# Altium footprint library Mylib.PcbLib: 294 footprints (part 6 of 19)
Each footprint in its own frame and in the unit in brackets; x right, y up, seen from the top. Pads: shape width x height; smd on the part's side, far side on the other; paste and mask are expansions set on the pad; w line width, h text height; cw(c..) or ccw(c..) is an arc to the next point about the centre after c.
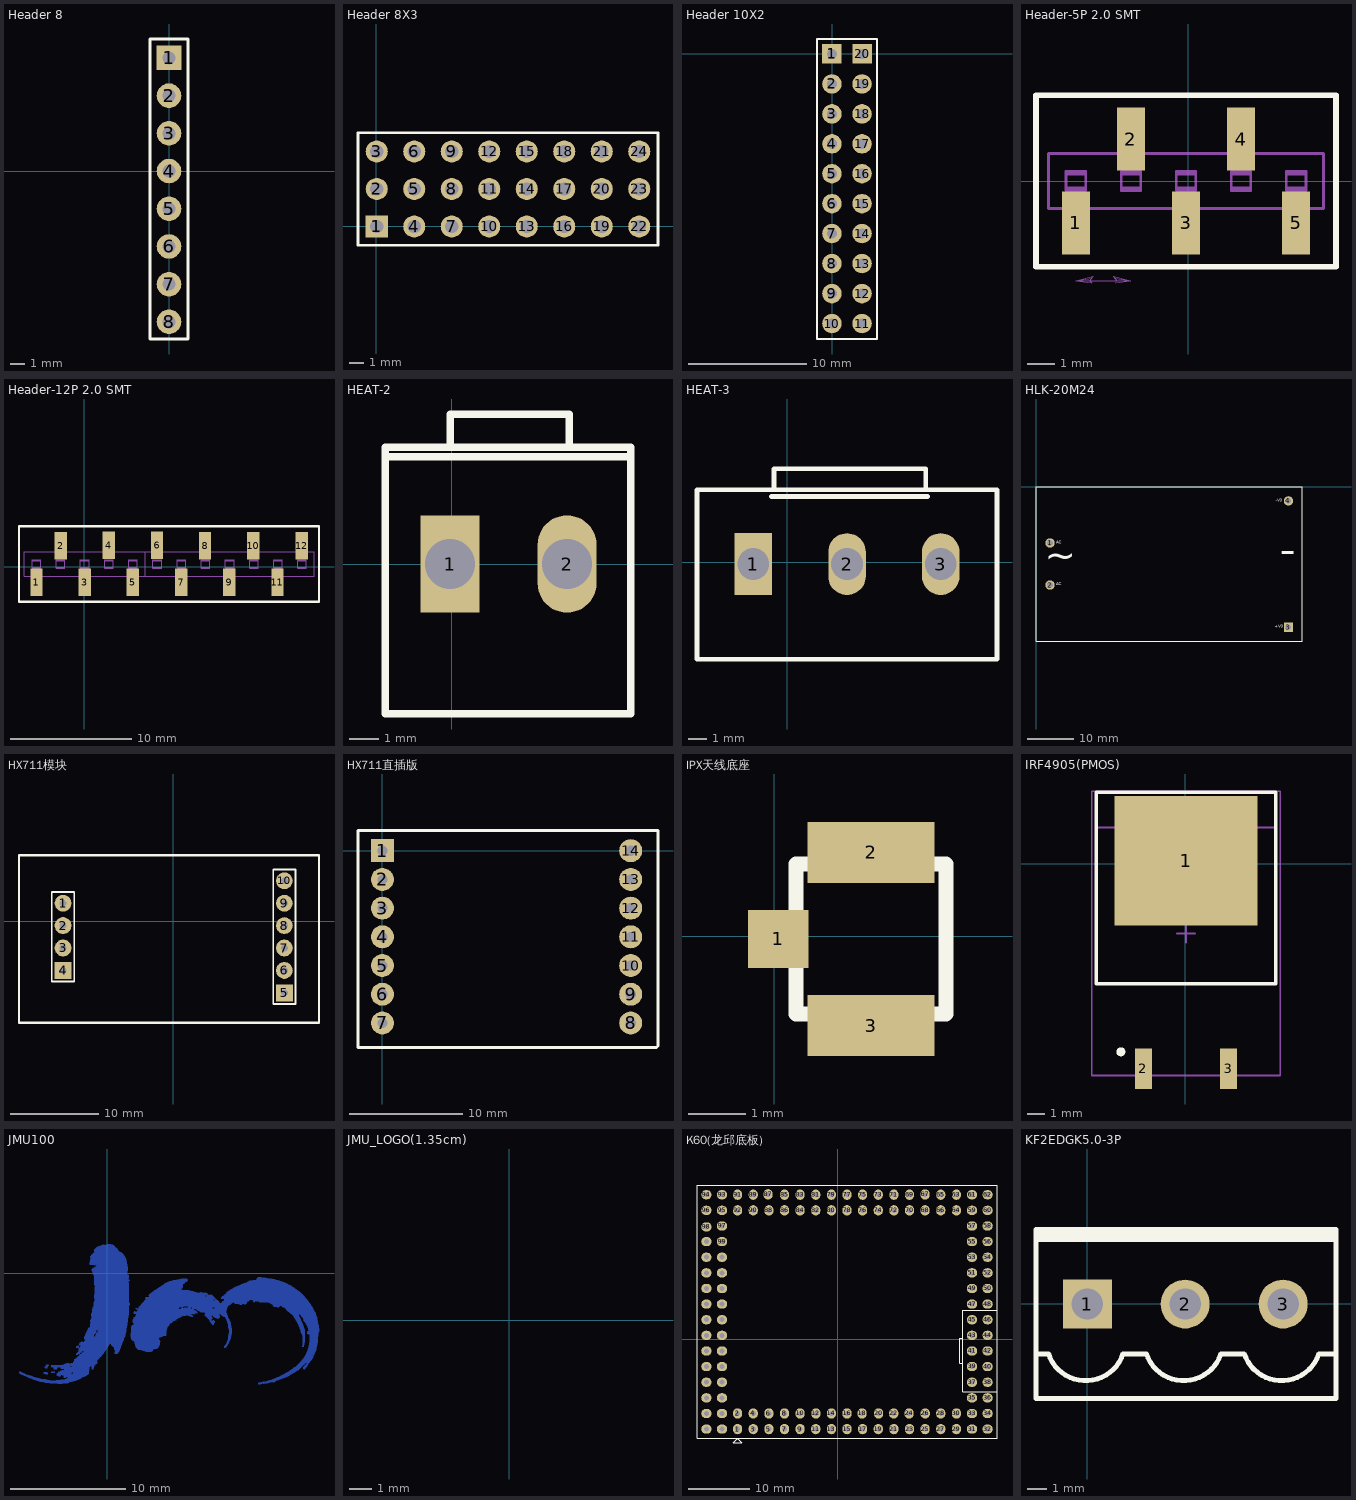
[diagram p5: the footprints below, top view; thin cyan lines are the x and y axes]

## Header 8 [mil]
pads (8):
  rect 65x65 hole 34: 1(0,300)
  round 65 hole 34: 2(0,200) 3(0,100) 4(0,0) 5(0,-99.8) 6(0,-199.8) 8(0,-399.61)
  round 65 hole 34 paste+0: 7(0,-299.61)
Top Overlay:
  lines w7.87: -50,-445 -50,350 50,350 50,-445 -50,-445
3D body "HDR1X8_2.54mm.STEP": height 336.22, standoff -118.11, extent -49,-451 51,349

## Header 8X3 [mm]
pads (24):
  rect 1.5x1.5 hole 0.9: 1(0.025,0)
  round 1.5 hole 0.9: 2(0.025,2.54) 3(0.025,5.08) 4(2.565,0) 5(2.565,2.54) 6(2.565,5.08) 7(5.105,0) 8(5.105,2.54) 9(5.105,5.08) 10(7.645,0) 11(7.645,2.54) 12(7.645,5.08) 13(10.185,0) 14(10.185,2.54) 15(10.185,5.08) 16(12.725,0) 17(12.725,2.54) 18(12.725,5.08) 19(15.265,0) 20(15.265,2.54) 21(15.265,5.08) 22(17.805,0) 23(17.805,2.54) 24(17.805,5.08)
Top Overlay:
  lines w0.2: -1.245,6.299 -1.245,-1.27 19.075,-1.27 19.075,6.299 ; -1.245,6.35 19.075,6.35
3D body "HEADER.STEP": height 7.58, standoff -2.94, extent 16.535,1.27 19.075,3.81
3D body "HEADER.STEP": height 7.58, standoff -2.94, extent 16.535,-1.27 19.075,1.27
3D body "HEADER.STEP": height 7.58, standoff -2.94, extent 13.995,1.27 16.535,3.81
3D body "HEADER.STEP": height 7.58, standoff -2.94, extent 13.995,-1.27 16.535,1.27
3D body "HEADER.STEP": height 7.58, standoff -2.94, extent 11.455,1.27 13.995,3.81
3D body "HEADER.STEP": height 7.58, standoff -2.94, extent 11.455,-1.27 13.995,1.27
3D body "HEADER.STEP": height 7.58, standoff -2.94, extent 8.915,1.27 11.455,3.81
3D body "HEADER.STEP": height 7.58, standoff -2.94, extent 8.915,-1.27 11.455,1.27
3D body "HEADER.STEP": height 7.58, standoff -2.94, extent 6.375,1.27 8.915,3.81
3D body "HEADER.STEP": height 7.58, standoff -2.94, extent 6.375,-1.27 8.915,1.27
3D body "HEADER.STEP": height 7.58, standoff -2.94, extent 3.835,1.27 6.375,3.81
3D body "HEADER.STEP": height 7.58, standoff -2.94, extent 3.835,-1.27 6.375,1.27
3D body "HEADER.STEP": height 7.58, standoff -2.94, extent 1.295,1.27 3.835,3.81
3D body "HEADER.STEP": height 7.58, standoff -2.94, extent 1.295,-1.27 3.835,1.27
3D body "HEADER.STEP": height 7.58, standoff -2.94, extent -1.245,1.27 1.295,3.81
3D body "HEADER.STEP": height 7.58, standoff -2.94, extent -1.245,-1.27 1.295,1.27
3D body "HEADER.STEP": height 7.58, standoff -2.94, extent -1.245,3.81 1.295,6.35
3D body "HEADER.STEP": height 7.58, standoff -2.94, extent 1.295,3.81 3.835,6.35
3D body "HEADER.STEP": height 7.58, standoff -2.94, extent 3.835,3.81 6.375,6.35
3D body "HEADER.STEP": height 7.58, standoff -2.94, extent 6.375,3.81 8.915,6.35
3D body "HEADER.STEP": height 7.58, standoff -2.94, extent 8.915,3.81 11.455,6.35
3D body "HEADER.STEP": height 7.58, standoff -2.94, extent 11.455,3.81 13.995,6.35
3D body "HEADER.STEP": height 7.58, standoff -2.94, extent 13.995,3.81 16.535,6.35
3D body "HEADER.STEP": height 7.58, standoff -2.94, extent 16.535,3.81 19.075,6.35

## Header 10X2 [mil]
pads (20):
  rect 65x65 hole 34: 1(-0.98,-0.2) 20(99.41,-0.2)
  round 65 hole 34: 2(-0.98,-100.2) 3(-0.98,-200.2) 4(-0.98,-300.2) 5(-0.98,-400) 6(-0.98,-500) 8(-0.98,-699.8) 10(-0.98,-900.2) 11(99.41,-900.2) 13(99.41,-699.8) 15(99.41,-500) 16(99.41,-400) 17(99.41,-300.2) 18(99.41,-200.2) 19(99.41,-100.2)
  round 65 hole 34 paste+0: 7(-0.98,-599.8) 9(-0.98,-800.2) 12(99.41,-800.2) 14(99.41,-599.8)
Top Overlay:
  lines w7.87: 49.02,-951.77 -50.98,-951.77 -50.98,49.8 49.02,49.8 ; 49.41,-951.77 149.41,-951.77 149.41,49.8 49.41,49.8
3D body "HDR-1x2_H.STEP": height 200.79, standoff -118.11, extent -13.19,-347.83 492.72,-247.83
3D body "HDR-1x2_H.STEP": height 200.79, standoff -118.11, extent -13.19,-447.83 492.72,-347.83
3D body "HDR-1x2_H.STEP": height 200.79, standoff -118.11, extent -13.19,-147.83 492.72,-47.83
3D body "HDR-1x2_H.STEP": height 200.79, standoff -118.11, extent -13.19,-247.83 492.72,-147.83
3D body "HDR-1x2_H.STEP": height 200.79, standoff -118.11, extent -13.19,-47.83 492.72,52.17
3D body "HDR-1x2_H.STEP": height 200.79, standoff -118.11, extent -13.19,-847.83 492.72,-747.83
3D body "HDR-1x2_H.STEP": height 200.79, standoff -118.11, extent -13.19,-947.83 492.72,-847.83
3D body "HDR-1x2_H.STEP": height 200.79, standoff -118.11, extent -13.19,-647.83 492.72,-547.83
3D body "HDR-1x2_H.STEP": height 200.79, standoff -118.11, extent -13.19,-747.83 492.72,-647.83
3D body "HDR-1x2_H.STEP": height 200.79, standoff -118.11, extent -13.19,-547.83 492.72,-447.83

## Header-5P 2.0 SMT [mil] "贴片单排"
pads (5):
  rect 40.16x90.16 smd mask+0: 1(-160.48,-60) 2(-81.74,60) 3(-3,-60) 4(75.74,60) 5(154.48,-60)
Top Overlay:
  lines w7.87: -217.53,-122.84 -217.53,122.84 211.53,122.84 211.53,-122.84 -217.53,-122.84
Top Paste:
  region: 134.4,-105.08 134.4,-14.92 174.56,-14.92 174.56,-105.08
  region: 55.66,14.92 55.66,105.08 95.82,105.08 95.82,14.92
  region: -23.08,-105.08 -23.08,-14.92 17.08,-14.92 17.08,-105.08
  region: -101.82,14.92 -101.82,105.08 -61.66,105.08 -61.66,14.92
  region: -180.56,-105.08 -180.56,-14.92 -140.4,-14.92 -140.4,-105.08
Top Solder:
  region: 132.39,-107.09 132.39,-12.91 176.57,-12.91 176.57,-107.09
  region: 53.65,12.91 53.65,107.09 97.83,107.09 97.83,12.91
  region: -25.09,-107.09 -25.09,-12.91 19.09,-12.91 19.09,-107.09
  region: -103.83,12.91 -103.83,107.09 -59.65,107.09 -59.65,12.91
  region: -182.57,-107.09 -182.57,-12.91 -138.39,-12.91 -138.39,-107.09
Mechanical 3:
  lines w3.94: -174.5,-10 -146.47,-10 ; -174.5,10 -146.47,10 ; -170.48,-39.33 -170.48,-85 -150.48,-85 -150.48,-39.33 ; -121.15,-39.33 -199.81,-39.33 -199.81,39.33 -121.15,39.33 ; -121.07,-39.33 -42.41,-39.33 ; -121.07,39.33 -42.41,39.33 ; -95.76,-10 -67.72,-10 ; -95.76,10 -67.72,10 ; -91.74,39.33 -91.74,85 -71.74,85 -71.74,39.33 ; -42.33,-39.33 36.33,-39.33 ; -42.33,39.33 36.33,39.33 ; -17.02,-10 11.02,-10 ; -17.02,10 11.02,10 ; -13,-39.33 -13,-85 7,-85 7,-39.33 ; 36.41,-39.33 115.07,-39.33 ; 36.41,39.33 115.07,39.33 ; 61.72,-10 89.76,-10 ; 61.72,10 89.76,10 ; 65.74,39.33 65.74,85 85.74,85 85.74,39.33 ; 115.15,-39.33 193.81,-39.33 193.81,39.33 115.15,39.33 ; 140.47,-10 168.5,-10 ; 140.47,10 168.5,10 ; 144.48,-39.33 144.48,-85 164.48,-85 164.48,-39.33 ; -174.5,-14.02 -146.47,-14.02 -146.47,14.02 -174.5,14.02 -174.5,-14.02 ; -95.76,-14.02 -67.72,-14.02 -67.72,14.02 -95.76,14.02 -95.76,-14.02 ; -17.02,-14.02 11.02,-14.02 11.02,14.02 -17.02,14.02 -17.02,-14.02 ; 61.72,-14.02 89.76,-14.02 89.76,14.02 61.72,14.02 61.72,-14.02 ; 140.47,-14.02 140.47,14.02 168.5,14.02 168.5,-14.02 140.47,-14.02
Mechanical 30:
  lines w0: -104.22,-145.63 -81.74,-142.52 ; -160.48,-142.52 -81.74,-142.52 ; -160.48,-142.52 -137.96,-139.37 -135.48,-136.26 ; -160.48,-142.52 -140.48,-142.52 ; -160.48,-142.52 -137.96,-145.63 -140.48,-142.52 ; -160.48,-142.52 -135.48,-136.26 ; -140.48,-142.52 -135.48,-136.26 ; -101.74,-142.52 -81.74,-142.52 ; -101.74,-142.52 -104.22,-139.37 -81.74,-142.52 ; -101.74,-142.52 -106.74,-136.26 -81.74,-142.52
Mechanical 32:
  lines w3.94: -217.53,-122.84 211.53,-122.84 211.53,122.84 -217.53,122.84 -217.53,-122.84

## Header-12P 2.0 SMT [mil]
pads (12):
  rect 40.16x90.16 smd mask+0: 1(-155.48,-51) 2(-76.74,69) 3(2,-51) 4(80.26,70) 5(159,-50) 6(237.74,70) 7(316.48,-50) 8(394.26,69) 9(473,-51) 10(551.74,69) 11(630.48,-51) 12(709.74,69)
Top Overlay:
  lines w7.87: -212.53,-113.84 766,-113.84 766,131.84 -212.53,131.84 -212.53,-113.84
Top Paste:
  region: -175.56,-96.08 -175.56,-5.92 -135.4,-5.92 -135.4,-96.08
  region: -96.82,23.92 -96.82,114.08 -56.66,114.08 -56.66,23.92
  region: -18.08,-96.08 -18.08,-5.92 22.08,-5.92 22.08,-96.08
  region: 60.66,23.92 60.66,114.08 100.82,114.08 100.82,23.92
  region: 139.4,-96.08 139.4,-5.92 179.56,-5.92 179.56,-96.08
  region: 296.4,-95.08 296.4,-4.92 336.56,-4.92 336.56,-95.08
  region: 531.66,23.92 531.66,114.08 571.82,114.08 571.82,23.92
  region: 452.92,-96.08 452.92,-5.92 493.08,-5.92 493.08,-96.08
  region: 373.92,24 373.92,114.16 414.08,114.16 414.08,24
  region: 217.84,25 217.84,115.16 258,115.16 258,25
  region: 610.92,-96.08 610.92,-5.92 651.08,-5.92 651.08,-96.08
  region: 689.66,23.92 689.66,114.08 729.82,114.08 729.82,23.92
Top Solder:
  region: -177.57,-98.09 -177.57,-3.91 -133.39,-3.91 -133.39,-98.09
  region: -98.83,21.91 -98.83,116.09 -54.65,116.09 -54.65,21.91
  region: -20.09,-98.09 -20.09,-3.91 24.09,-3.91 24.09,-98.09
  region: 58.65,21.91 58.65,116.09 102.83,116.09 102.83,21.91
  region: 137.39,-98.09 137.39,-3.91 181.57,-3.91 181.57,-98.09
  region: 294.39,-97.09 294.39,-2.91 338.57,-2.91 338.57,-97.09
  region: 608.39,-98.09 608.39,-3.91 652.57,-3.91 652.57,-98.09
  region: 529.65,21.91 529.65,116.09 573.83,116.09 573.83,21.91
  region: 450.91,-98.09 450.91,-3.91 495.09,-3.91 495.09,-98.09
  region: 371.82,22 371.82,116.18 416,116.18 416,22
  region: 215.91,22 215.91,116.18 260.09,116.18 260.09,22
  region: 687.65,21.91 687.65,116.09 731.83,116.09 731.83,21.91
Mechanical 3:
  drawing of 156 lines, arcs and shapes, not listed

## HEAT-2 [mm]
pads (2):
  rect 2x3.3 hole 1.7: 1(-0.051,0.007)
  oval 2x3.3 hole 1.7: 2(3.909,0.007)
Top Overlay:
  lines w0.254: -2.251,3.639 6.069,3.639 ; -0.051,3.967 -0.051,5.087 3.988,5.087 3.988,3.967 ; -2.251,-5.073 -2.251,3.967 6.069,3.967 6.069,-5.073 -2.251,-5.073
3D body "molex-22-27-2021.STEP": height 11.68, standoff -3.56, extent -0.47,-3.57 4.61,2.78

## HEAT-3 [mm]
pads (3):
  rect 2x3.3 hole 1.7: 1(-1.8,-0.1)
  oval 2x3.3 hole 1.7: 2(3.2,-0.1) 3(8.2,-0.1)
Top Overlay:
  lines w0.254: -0.82,3.5 7.5,3.5 ; -0.7,3.867 -0.7,4.987 2.359,4.987 4.378,4.987 7.4,4.987 7.4,3.867 ; -4.8,-5.173 11.2,-5.173 11.2,3.867 -4.8,3.867 -4.8,-5.173
3D body "molex-22-27-2031.STEP": height 11.68, standoff -3.56, extent -0.457,-3.734 7.163,2.616

## HLK-20M24 [mm] "HILINK 24V隔离电源模块"
pads (4):
  round 2 hole 1.2: 1(3,-12) 2(3,-21) 4(54,-3)
  rect 2x2 hole 1.2: 3(54,-30)
Top Overlay:
  lines w0.1: 0,-33 0,0 57,0 57,-33 0,-33
  text "-V0" at 51.317,-3.4 h1.02
  text "+V0" at 51.075,-30.4 h1.02
  text "AC" at 4.375,-21.275 h1.02
  text "AC" at 4.375,-12.35 h1.02
  text "~" at 1.925,-19.35 h10
  text "-" at 52.175,-18.856 h12
3D body "20M4_3.step": height 22.6, standoff -6, extent 0,-33 57,0

## HX711模块 [mil]
pads (10):
  round 75 hole 30: 1(-492.49,81.19) 2(-492.49,-18.81) 3(-492.49,-118.81) 6(495.26,-219) 7(495.26,-119) 8(495.26,-19) 9(495.26,81) 10(495.26,181)
  rect 75x75 hole 30: 4(-492.49,-218.81) 5(495.26,-319)
Top Overlay:
  lines w7.87: -542.49,-268.81 -542.49,131.19 -442.49,131.19 -442.49,-268.81 -542.49,-268.81 ; 445.26,-369 445.26,231 545.26,231 545.26,-369 445.26,-369
  lines w10: -688.98,-452.76 -688.98,295.28 649.61,295.28 649.61,-452.76 -688.98,-452.76
3D body: height 340, standoff 300, extent -669.29,-433.07 629.92,275.59
3D body: height 336.22, standoff -118.11, extent -540.94,-262.99 -440.94,137.01
3D body: height 336.22, standoff -118.11, extent 445.26,-368.99 545.26,231.01

## HX711直插版 [mil]
pads (14):
  rect 80x80 hole 35.43: 1(0,0)
  round 80 hole 35.43: 2(0,-100) 3(0,-200) 4(0,-300) 5(0,-400) 6(0,-500) 7(0,-600) 8(865,-600) 9(865,-500) 10(865,-400) 11(865,-300) 12(865,-200) 13(865,-100) 14(865,0)
Top Overlay:
  lines w10: -85,-685 955,-685 960,-680 960,70 -85,70 -85,-685
Bottom Overlay:
  lines w7.87: -50,-650 -50,50 50,50 50,-650 -50,-650 ; 815,-650 915,-650 915,50 815,50 815,-650

## IPX天线底座 [mm]
pads (3):
  rect 1.05x1 smd: 1(0.073,-0.048)
  rect 2.2x1.05 smd: 2(1.681,1.452) 3(1.681,-1.548)
Top Overlay:
  lines w0.254: 0.381,-1.348 0.381,1.252 2.981,1.252 2.981,-1.348 0.381,-1.348
3D body "User Library-1909763-1.STEP": height 1.3, standoff 0.02, extent 0.149,-1.574 2.999,1.426

## IRF4905(PMOS) [mm] "IRF4905"
pads (3):
  rect 8x7.2 smd: 1(0.047,0.174)
  rect 0.95x2.25 smd: 2(-2.333,-11.426) 3(2.427,-11.426)
Top Overlay:
  circle w0.25: c-3.585,-10.478 r0.125
  lines w0.2: -4.953,-6.676 -4.953,3.998 5.047,3.998 5.047,-6.676 -4.953,-6.676
Mechanical 13:
  lines w0.1: -4.953,-6.676 5.047,-6.676 5.047,2.024 -4.953,2.024 -4.953,-6.676
Mechanical 15:
  lines w0.1: -0.453,-3.876 0.547,-3.876 ; 0.047,-4.376 0.047,-3.376 ; -5.203,-11.801 5.297,-11.801 5.297,4.049 -5.203,4.049 -5.203,-11.801
3D body "User Library-DPAK-1.STEP": height 2.39, standoff -0.02, extent -3.323,-10.459 3.217,-0.52

## JMU100 [mm]
Bottom Layer:
  lines w0.043: -7.654,-8.545 -7.395,-8.545 ; -7.654,-8.502 -7.481,-8.502 ; -7.611,-8.588 -7.309,-8.588 ; -7.525,-8.631 -7.179,-8.631 ; -7.481,-8.675 -7.136,-8.675 ; -7.395,-8.718 -7.05,-8.718 ; -7.266,-8.761 -6.92,-8.761 ; -7.179,-8.804 -6.747,-8.804 ; -7.05,-8.847 -6.575,-8.847 ; -6.963,-8.89 -6.488,-8.89 ; -6.877,-8.934 -6.402,-8.934 ; -6.791,-8.977 -6.272,-8.977 ; -6.704,-9.02 -6.056,-9.02 ; -6.531,-9.063 -5.884,-9.063 ; -6.445,-9.106 -5.754,-9.106 ; -6.359,-9.15 -5.366,-9.15 ; -6.186,-9.193 -5.193,-9.193 ; -6.1,-9.236 -4.977,-9.236 ; -5.927,-9.279 -2.904,-9.279 ; -5.841,-9.322 -3.034,-9.322 ; -5.495,-9.365 -3.293,-9.365 ; -5.495,-8.631 -5.15,-8.631 ; -5.495,-8.588 -5.15,-8.588 ; -5.495,-8.545 -5.236,-8.545 ; -5.409,-8.113 -5.193,-8.113 ; -5.409,-8.07 -5.193,-8.07 ; -5.366,-9.409 -3.336,-9.409 ; -5.366,-8.156 -5.193,-8.156 ; -5.322,-8.675 -5.15,-8.675 ; -5.322,-8.027 -5.15,-8.027 ; -5.322,-7.984 -5.15,-7.984 ; -5.279,-7.94 -5.063,-7.94 ; -5.279,-7.897 -5.107,-7.897 ; -4.977,-9.452 -3.422,-9.452 ; -4.847,-8.545 -4.545,-8.545 ; -4.847,-8.502 -4.545,-8.502 ; -4.847,-8.027 -3.207,-8.027 ; -4.847,-7.984 -3.207,-7.984 ; -4.847,-7.94 -1.134,-7.94 ; -4.804,-8.07 -3.207,-8.07 ; -4.632,-8.243 -4.372,-8.243 ; -4.632,-8.2 -4.372,-8.2 ; -4.632,-8.156 -4.329,-8.156 ; -4.632,-8.113 -4.329,-8.113 ; -4.416,-9.236 -2.732,-9.236 ; -4.372,-8.761 -4.027,-8.761 ; -4.372,-8.718 -1.695,-8.718 ; -4.372,-8.675 -3.12,-8.675 ; -4.329,-8.804 -4.027,-8.804 ; -4.329,-8.631 -3.12,-8.631 ; -4.286,-9.495 -3.897,-9.495 ; -4.243,-8.847 -4.027,-8.847 ; -4.243,-8.588 -3.12,-8.588 ; -4.243,-8.545 -3.077,-8.545 ; -4.243,-8.502 -1.609,-8.502 ; -4.07,-8.459 -1.609,-8.459 ; -4.027,-9.193 -2.645,-9.193 ; -4.027,-8.415 -1.609,-8.415 ; -4.027,-8.156 -1.566,-8.156 ; -4.027,-8.113 -1.566,-8.113 ; -3.984,-8.2 -1.566,-8.2 ; -3.941,-8.372 -1.566,-8.372 ; -3.897,-8.761 -1.782,-8.761 ; -3.854,-7.897 -1.048,-7.897 ; -3.768,-8.934 -3.552,-8.934 ; -3.768,-8.89 -1.998,-8.89 ; -3.768,-8.847 -1.911,-8.847 ; -3.768,-8.804 -1.825,-8.804 ; -3.725,-8.977 -3.595,-8.977 ; -3.725,-8.329 -1.566,-8.329 ; -3.725,-8.286 -1.609,-8.286 ; -3.725,-8.243 -1.609,-8.243 ; -3.725,-7.854 -1.048,-7.854 ; -3.638,-9.15 -2.516,-9.15 ; -3.638,-7.811 -1.048,-7.811 ; -3.552,-9.106 -2.429,-9.106 ; -3.509,-7.768 -3.336,-7.768 ; -3.466,-9.063 -2.343,-9.063 ; -3.422,-9.02 -2.257,-9.02 ; -3.422,-8.977 -2.213,-8.977 ; -3.422,-8.934 -2.17,-8.934 ; -3.12,-7.768 -0.918,-7.768 ; -3.077,-8.07 -1.566,-8.07 ; -3.077,-8.027 -1.523,-8.027 ; -3.077,-7.984 -1.134,-7.984 ; -2.991,-8.675 -1.652,-8.675 ; -2.948,-8.631 -1.609,-8.631 ; -2.948,-8.588 -1.609,-8.588 ; -2.948,-8.545 -1.609,-8.545 ; -2.948,-7.725 -0.875,-7.725 ; -2.948,-7.681 -0.875,-7.681 ; -2.904,-7.638 -0.875,-7.638 ; -2.904,-7.595 -0.918,-7.595 ; -2.861,-7.552 -0.918,-7.552 ; -2.861,-7.509 -0.918,-7.509 ; -2.861,-7.465 -0.875,-7.465 ; -2.861,-7.422 -0.832,-7.422 ; -2.775,-7.379 -0.789,-7.379 ; -2.688,-7.336 -0.745,-7.336 ; -2.688,-6.991 -2.559,-6.991 ; -2.688,-6.947 -2.516,-6.947 ; -2.688,-6.386 -2.473,-6.386 ; -2.688,-6.343 -2.473,-6.343 ; -2.645,-7.293 -0.702,-7.293 ; -2.645,-6.904 -2.386,-6.904 ; -2.645,-6.3 -2.473,-6.3 ; -2.602,-7.25 -0.659,-7.25 ; -2.602,-6.861 -2.386,-6.861 ; -2.559,-7.206 -0.659,-7.206 ; -2.559,-6.818 -2.343,-6.818 ; -2.559,-6.256 -2.473,-6.256 ; -2.516,-7.163 -0.573,-7.163 ; -2.516,-6.775 -2.213,-6.775 ; -2.473,-6.731 -2.213,-6.731 ; -2.473,-6.688 -2.17,-6.688 ; -2.473,-6.645 -0.184,-6.645 ; -2.473,-6.602 -0.141,-6.602 ; -2.473,-6.559 -0.141,-6.559 ; -2.473,-6.516 -0.098,-6.516 ; -2.473,-6.472 -0.098,-6.472 ; -2.473,-6.429 -0.054,-6.429 ; -2.429,-7.12 -0.529,-7.12 ; -2.429,-7.077 -0.486,-7.077 ; -2.429,-6.17 0.118,-6.17 ; -2.429,-6.127 0.161,-6.127 ; -2.429,-6.084 0.161,-6.084 ; -2.386,-7.034 -0.486,-7.034 ; -2.386,-6.991 -0.443,-6.991 ; -2.386,-6.041 1.241,-6.041 ; -2.386,-5.997 1.284,-5.997 ; -2.343,-6.386 -0.011,-6.386 ; -2.343,-6.343 -0.011,-6.343 ; -2.3,-6.3 0.032,-6.3 ; -2.3,-6.256 0.075,-6.256 ; -2.3,-6.213 0.118,-6.213 ; -2.3,-5.954 1.284,-5.954 ; -2.257,-6.947 -0.4,-6.947 ; -2.257,-5.911 -2.17,-5.911 ; -2.213,-6.904 -0.357,-6.904 ; -2.213,-6.861 -0.314,-6.861 ; -2.084,-6.818 -0.314,-6.818 ; -2.041,-6.775 -0.27,-6.775 ; -2.041,-6.731 -0.227,-6.731 ; -2.041,-6.688 -0.227,-6.688 ; -1.998,-5.911 1.327,-5.911 ; -1.998,-5.868 1.327,-5.868 ; -1.998,-5.609 1.414,-5.609 ; -1.998,-5.566 1.414,-5.566 ; -1.998,-5.522 1.457,-5.522 ; -1.998,-5.479 1.5,-5.479 ; -1.954,-5.825 1.327,-5.825 ; -1.954,-5.652 1.414,-5.652 ; -1.954,-5.436 -1.177,-5.436 ; -1.911,-5.781 1.37,-5.781 ; -1.911,-5.738 1.414,-5.738 ; -1.911,-5.695 1.414,-5.695 ; -1.911,-5.393 -1.177,-5.393 ; -1.911,-5.35 -1.177,-5.35 ; -1.911,-5.306 -1.177,-5.306 ; -1.868,-5.263 -1.134,-5.263 ; -1.868,-5.22 -1.134,-5.22 ; -1.868,-5.177 -1.091,-5.177 ; -1.825,-5.134 -0.961,-5.134 ; -1.782,-5.091 -0.961,-5.091 ; -1.782,-5.047 -0.961,-5.047 ; -1.782,-5.004 -0.961,-5.004 ; -1.738,-4.961 -0.961,-4.961 ; -1.695,-4.918 -0.961,-4.918 ; -1.695,-4.875 -0.961,-4.875 ; -1.695,-4.832 1.63,-4.832 ; -1.652,-4.788 1.63,-4.788 ; -1.652,-4.745 1.63,-4.745 ; -1.609,-4.702 1.63,-4.702 ; -1.566,0.825 1.673,0.825 ; -1.523,-4.659 1.673,-4.659 ; -1.523,0.868 1.673,0.868 ; -1.523,0.911 1.673,0.911 ; -1.523,0.955 1.673,0.955 ; -1.523,0.998 1.673,0.998 ; -1.479,-4.616 1.673,-4.616 ; -1.479,-4.572 1.673,-4.572 ; -1.479,-4.529 1.673,-4.529 ; -1.479,-4.486 1.716,-4.486 ; -1.479,-4.443 1.716,-4.443 ; -1.479,-4.4 1.716,-4.4 ; -1.479,-4.357 1.716,-4.357 ; -1.479,-4.313 1.716,-4.313 ; -1.479,-4.141 1.759,-4.141 ; -1.479,-4.097 1.759,-4.097 ; -1.479,-4.054 1.759,-4.054 ; -1.479,0.782 1.716,0.782 ; -1.479,1.041 1.63,1.041 ; -1.479,1.084 1.63,1.084 ; -1.479,1.127 1.63,1.127 ; -1.479,1.171 1.63,1.171 ; -1.479,1.214 1.63,1.214 ; -1.479,1.43 1.5,1.43 ; -1.479,1.473 1.5,1.473 ; -1.436,-4.27 1.716,-4.27 ; -1.436,-4.227 1.716,-4.227 ; -1.436,-4.184 1.759,-4.184 ; -1.436,-4.011 1.759,-4.011 ; -1.436,1.257 1.586,1.257 ; -1.436,1.3 1.586,1.3 ; -1.436,1.343 1.543,1.343 ; -1.436,1.386 1.543,1.386 ; -1.393,-3.968 1.759,-3.968 ; -1.393,-3.925 1.759,-3.925 ; -1.393,-3.882 1.759,-3.882 ; -1.393,-3.666 1.802,-3.666 ; -1.393,-3.622 1.802,-3.622 ; -1.393,-3.579 1.845,-3.579 ; -1.393,-3.536 1.845,-3.536 ; -1.393,-3.493 1.845,-3.493 ; -1.393,1.516 1.457,1.516 ; -1.393,1.559 1.414,1.559 ; -1.35,-8.243 -1.22,-8.243 ; -1.35,-8.2 -1.22,-8.2 ; -1.35,-8.156 -1.177,-8.156 ; -1.35,-8.113 -1.177,-8.113 ; -1.35,-8.07 -1.177,-8.07 ; -1.35,-8.027 -1.177,-8.027 ; -1.35,-3.838 1.759,-3.838 ; -1.35,-3.795 1.802,-3.795 ; -1.35,-3.752 1.802,-3.752 ; -1.35,-3.709 1.802,-3.709 ; -1.35,-3.45 1.845,-3.45 ; -1.35,-3.407 1.845,-3.407 ; -1.35,0.264 1.759,0.264 ; -1.35,0.307 1.759,0.307 ; -1.35,0.35 1.759,0.35 ; -1.35,1.602 1.414,1.602 ; -1.307,-3.363 1.845,-3.363 ; -1.307,-3.32 1.845,-3.32 ; -1.307,-3.277 1.845,-3.277 ; -1.307,-3.234 1.845,-3.234 ; -1.307,-3.191 1.845,-3.191 ; -1.307,-3.147 1.845,-3.147 ; -1.307,-3.104 1.845,-3.104 ; -1.307,0.177 1.716,0.177 ; -1.307,0.221 1.716,0.221 ; -1.307,0.393 1.759,0.393 ; -1.307,1.645 1.37,1.645 ; -1.263,-3.061 1.845,-3.061 ; -1.263,-3.018 1.845,-3.018 ; -1.263,-2.975 1.845,-2.975 ; -1.263,-2.932 1.845,-2.932 ; -1.263,0.091 1.716,0.091 ; -1.263,0.134 1.716,0.134 ; -1.263,0.436 1.759,0.436 ; -1.263,1.689 1.327,1.689 ; -1.22,-2.888 1.845,-2.888 ; -1.22,-0.039 1.716,-0.039 ; -1.22,0.005 1.716,0.005 ; -1.22,0.048 1.716,0.048 ; -1.22,1.732 1.284,1.732 ; -1.177,-2.845 1.845,-2.845 ; -1.177,-2.802 1.845,-2.802 ; -1.177,-2.759 1.889,-2.759 ; -1.177,-2.716 1.889,-2.716 ; -1.177,-2.673 1.932,-2.673 ; -1.177,-2.629 1.932,-2.629 ; -1.177,-2.586 1.932,-2.586 ; -1.177,-2.543 1.889,-2.543 ; -1.177,-2.5 1.845,-2.5 ; -1.177,-0.168 1.845,-0.168 ; -1.177,-0.125 1.802,-0.125 ; -1.177,-0.082 1.716,-0.082 ; -1.177,0.48 1.759,0.48 ; -1.177,1.775 1.241,1.775 ; -1.134,-2.457 1.845,-2.457 ; -1.134,-2.413 1.845,-2.413 ; -1.134,-2.111 1.845,-2.111 ; -1.134,-2.068 1.845,-2.068 ; -1.134,-2.025 1.845,-2.025 ; -1.134,-1.982 1.845,-1.982 ; -1.134,-1.938 1.845,-1.938 ; -1.134,-1.895 1.845,-1.895 ; -1.134,-1.852 1.845,-1.852 ; -1.134,-0.945 1.845,-0.945 ; -1.134,-0.902 1.845,-0.902 ; -1.134,-0.859 1.845,-0.859 ; -1.134,-0.816 1.845,-0.816 ; -1.134,-0.773 1.802,-0.773 ; -1.134,-0.729 1.802,-0.729 ; -1.134,-0.686 1.802,-0.686 ; -1.134,-0.643 1.845,-0.643 ; -1.134,-0.6 1.932,-0.6 ; -1.134,-0.557 1.889,-0.557 ; -1.134,-0.514 1.802,-0.514 ; -1.134,-0.47 1.802,-0.47 ; -1.134,-0.427 1.802,-0.427 ; -1.134,-0.384 1.845,-0.384 ; -1.134,-0.341 1.845,-0.341 ; -1.134,-0.298 1.845,-0.298 ; -1.134,-0.254 1.845,-0.254 ; -1.134,-0.211 1.845,-0.211 ; -1.134,0.739 -1.048,0.739 ; -1.134,1.905 0.982,1.905 ; -1.134,1.948 0.982,1.948 ; -1.134,1.991 0.896,1.991 ; -1.134,2.034 0.896,2.034 ; -1.134,2.077 0.896,2.077 ; -1.091,-2.37 1.845,-2.37 ; -1.091,-2.327 1.845,-2.327 ; -1.091,-2.284 1.845,-2.284 ; -1.091,-2.241 1.845,-2.241 ; -1.091,-2.198 1.845,-2.198 ; -1.091,-2.154 1.845,-2.154 ; -1.091,-1.809 1.845,-1.809 ; -1.091,-1.766 1.845,-1.766 ; -1.091,-1.723 1.845,-1.723 ; -1.091,-1.679 1.845,-1.679 ; -1.091,-1.636 1.845,-1.636 ; -1.091,-1.593 1.845,-1.593 ; -1.091,-1.55 1.845,-1.55 ; -1.091,-1.507 1.845,-1.507 ; -1.091,-1.463 1.845,-1.463 ; -1.091,-1.42 1.845,-1.42 ; -1.091,-1.377 1.845,-1.377 ; -1.091,-1.334 1.845,-1.334 ; -1.091,-1.291 1.845,-1.291 ; -1.091,-1.248 1.845,-1.248 ; -1.091,-1.204 1.845,-1.204 ; -1.091,-1.032 1.845,-1.032 ; -1.091,-0.988 1.845,-0.988 ; -1.091,0.523 1.759,0.523 ; -1.091,1.818 1.198,1.818 ; -1.091,1.861 1.068,1.861 ; -1.048,-5.436 1.5,-5.436 ; -1.048,-5.393 1.543,-5.393 ; -1.048,-1.161 1.845,-1.161 ; -1.048,-1.118 1.845,-1.118 ; -1.048,-1.075 1.845,-1.075 ; -1.048,0.566 1.759,0.566 ; -1.048,2.12 0.852,2.12 ; -1.004,-5.35 1.543,-5.35 ; -1.004,-5.306 1.543,-5.306 ; -1.004,2.164 0.809,2.164 ; -0.961,-5.263 1.543,-5.263 ; -0.961,-5.22 1.543,-5.22 ; -0.961,-5.177 1.586,-5.177 ; -0.961,0.609 1.716,0.609 ; -0.961,0.739 1.716,0.739 ; -0.961,2.207 0.766,2.207 ; -0.918,0.652 1.716,0.652 ; -0.918,0.696 1.716,0.696 ; -0.918,2.25 0.68,2.25 ; -0.875,-5.134 1.586,-5.134 ; -0.875,2.293 0.636,2.293 ; -0.832,-5.091 1.586,-5.091 ; -0.832,-5.047 1.586,-5.047 ; -0.832,-5.004 1.63,-5.004 ; -0.832,-4.961 1.63,-4.961 ; -0.832,-4.918 1.63,-4.918 ; -0.832,-4.875 1.63,-4.875 ; -0.745,2.336 0.636,2.336 ; -0.616,2.38 0.593,2.38 ; -0.486,2.423 0.55,2.423 ; -0.4,2.466 -0.27,2.466 ; -0.141,2.466 0.464,2.466 ; 0.032,2.509 0.291,2.509 ; 0.334,-6.127 1.241,-6.127 ; 0.334,-6.084 1.241,-6.084 ; 0.377,-6.213 1.198,-6.213 ; 0.377,-6.17 1.241,-6.17 ; 0.464,-6.3 1.155,-6.3 ; 0.464,-6.256 1.155,-6.256 ; 0.55,-6.343 1.155,-6.343 ; 0.593,-6.559 1.068,-6.559 ; 0.593,-6.516 1.068,-6.516 ; 0.593,-6.472 1.111,-6.472 ; 0.593,-6.429 1.111,-6.429 ; 0.593,-6.386 1.155,-6.386 ; 0.636,-6.904 0.852,-6.904 ; 0.636,-6.861 0.896,-6.861 ; 0.636,-6.818 0.939,-6.818 ; 0.636,-6.775 0.939,-6.775 ; 0.68,-6.731 0.982,-6.731 ; 0.68,-6.688 1.025,-6.688 ; 0.68,-6.645 1.025,-6.645 ; 0.68,-6.602 1.068,-6.602 ; 2.018,-5.479 4.609,-5.479 ; 2.018,-5.436 4.739,-5.436 ; 2.018,-5.393 4.782,-5.393 ; 2.018,-5.35 5.041,-5.35 ; 2.018,-5.306 5.084,-5.306 ; 2.018,-5.263 5.084,-5.263 ; 2.018,-5.22 5.084,-5.22 ; 2.018,-5.177 5.084,-5.177 ; 2.061,-5.652 4.436,-5.652 ; 2.061,-5.609 4.436,-5.609 ; 2.061,-5.566 4.436,-5.566 ; 2.061,-5.522 4.479,-5.522 ; 2.061,-5.134 5.084,-5.134 ; 2.061,-5.091 5.084,-5.091 ; 2.061,-5.047 5.084,-5.047 ; 2.061,-5.004 5.084,-5.004 ; 2.061,-4.961 5.084,-4.961 ; 2.061,-4.918 5.084,-4.918 ; 2.061,-4.875 5.127,-4.875 ; 2.061,-4.832 5.127,-4.832 ; 2.061,-4.788 5.127,-4.788 ; 2.061,-4.745 5.127,-4.745 ; 2.061,-4.702 5.17,-4.702 ; 2.061,-4.659 5.17,-4.659 ; 2.061,-4.616 5.17,-4.616 ; 2.105,-5.695 4.436,-5.695 ; 2.105,-4.572 5.214,-4.572 ; 2.105,-4.529 5.257,-4.529 ; 2.148,-5.738 4.479,-5.738 ; 2.148,-4.486 5.3,-4.486 ; 2.191,-5.781 4.523,-5.781 ; 2.191,-4.184 5.602,-4.184 ; 2.191,-4.141 5.645,-4.141 ; 2.191,-4.097 5.688,-4.097 ; 2.191,-4.054 5.818,-4.054 ; 2.191,-4.011 5.948,-4.011 ; 2.234,-4.227 5.559,-4.227 ; 2.234,-3.968 5.948,-3.968 ; 2.277,-5.825 4.523,-5.825 ; 2.277,-4.443 5.343,-4.443 ; 2.277,-4.4 5.343,-4.4 ; 2.277,-4.357 5.343,-4.357 ; 2.277,-4.313 5.386,-4.313 ; 2.277,-4.27 5.516,-4.27 ; 2.277,-3.925 5.948,-3.925 ; 2.277,-3.882 6.077,-3.882 ; 2.277,-3.838 6.12,-3.838 ; 2.277,-3.795 6.207,-3.795 ; 2.277,-3.45 7.545,-3.45 ; 2.277,-3.407 7.761,-3.407 ; 2.277,-3.363 7.761,-3.363 ; 2.32,-5.868 4.566,-5.868 ; 2.32,-3.32 7.718,-3.32 ; 2.32,-3.277 2.364,-3.277 ; 2.364,-6.041 4.523,-6.041 ; 2.364,-5.997 4.523,-5.997 ; 2.364,-5.954 4.523,-5.954 ; 2.364,-5.911 4.523,-5.911 ; 2.407,-6.213 4.479,-6.213 ; 2.407,-6.17 4.479,-6.17 ; 2.407,-6.127 4.523,-6.127 ; 2.407,-6.084 4.523,-6.084 ; 2.407,-3.752 6.336,-3.752 ; 2.45,-6.343 4.436,-6.343 ; 2.45,-6.3 4.436,-6.3 ; 2.45,-6.256 4.436,-6.256 ; 2.45,-3.709 6.379,-3.709 ; 2.45,-3.666 6.466,-3.666 ; 2.45,-3.622 6.768,-3.622 ; 2.45,-3.018 2.58,-3.018 ; 2.493,-6.386 4.35,-6.386 ; 2.493,-3.579 7.243,-3.579 ; 2.493,-3.536 7.243,-3.536 ; 2.493,-3.493 7.243,-3.493 ; 2.493,-3.061 6.163,-3.061 ; 2.536,-6.429 4.35,-6.429 ; 2.58,-6.472 4.264,-6.472 ; 2.58,-3.277 7.718,-3.277 ; 2.58,-3.234 7.632,-3.234 ; 2.623,-6.516 4.048,-6.516 ; 2.623,-3.191 7.545,-3.191 ; 2.623,-3.147 7.502,-3.147 ; 2.623,-3.104 7.459,-3.104 ; 2.666,-6.559 3.918,-6.559 ; 2.709,-3.018 6.163,-3.018 ; 2.709,-2.975 6.163,-2.975 ; 2.709,-2.932 6.163,-2.932 ; 2.709,-2.888 6.293,-2.888 ; 2.795,-2.845 6.552,-2.845 ; 2.839,-2.802 10.395,-2.802 ; 2.882,-2.759 10.438,-2.759 ; 2.925,-2.716 10.525,-2.716 ; 2.925,-2.673 10.611,-2.673 ; 2.968,-6.602 3.918,-6.602 ; 2.968,-2.629 10.654,-2.629 ; 3.011,-2.586 10.697,-2.586 ; 3.055,-6.645 3.918,-6.645 ; 3.055,-2.543 9.661,-2.543 ; 3.098,-2.5 9.661,-2.5 ; 3.141,-2.457 9.661,-2.457 ; 3.184,-2.413 9.618,-2.413 ; 3.184,-2.37 9.532,-2.37 ; 3.227,-6.688 3.875,-6.688 ; 3.227,-2.327 9.143,-2.327 ; 3.27,-2.154 9.272,-2.154 ; 3.27,-2.111 9.272,-2.111 ; 3.314,-2.284 9.143,-2.284 ; 3.314,-2.241 9.143,-2.241 ; 3.314,-2.198 9.359,-2.198 ; 3.357,-6.731 3.789,-6.731 ; 3.357,-2.068 9.229,-2.068 ; 3.573,-1.895 8.452,-1.895 ; 3.616,-2.025 9.186,-2.025 ; 3.616,-1.982 8.452,-1.982 ; 3.616,-1.938 8.452,-1.938 ; 3.616,-1.852 8.711,-1.852 ; 3.616,-1.809 8.668,-1.809 ; 3.702,-1.766 8.668,-1.766 ; 3.745,-1.723 8.582,-1.723 ; 3.789,-1.679 7.847,-1.679 ; 3.875,-1.636 7.675,-1.636 ; 3.918,-1.593 7.502,-1.593 ; 4.004,-1.55 7.416,-1.55 ; 4.048,-1.507 7.2,-1.507 ; 4.048,-1.463 7.027,-1.463 ; 4.177,-1.42 6.423,-1.42 ; 4.264,-1.377 6.379,-1.377 ; 4.307,-1.334 6.379,-1.334 ; 4.35,-1.291 6.379,-1.291 ; 4.436,-1.248 6.466,-1.248 ; 4.479,-1.204 6.466,-1.204 ; 4.566,-1.161 6.509,-1.161 ; 4.652,-1.118 6.509,-1.118 ; 4.695,-1.075 6.509,-1.075 ; 4.739,-1.032 6.509,-1.032 ; 4.868,-0.988 6.509,-0.988 ; 4.868,-0.945 6.509,-0.945 ; 4.911,-0.902 6.509,-0.902 ; 4.998,-0.859 6.638,-0.859 ; 5.084,-0.816 6.638,-0.816 ; 5.17,-0.773 6.682,-0.773 ; 5.257,-0.729 6.725,-0.729 ; 5.386,-0.686 6.854,-0.686 ; 5.559,-0.643 6.898,-0.643 ; 5.688,-0.6 6.898,-0.6 ; 5.991,-0.557 6.941,-0.557 ; 6.207,-0.514 6.898,-0.514 ; 6.336,-3.061 7.459,-3.061 ; 6.379,-3.018 7.2,-3.018 ; 6.379,-0.47 6.854,-0.47 ; 6.423,-2.975 6.509,-2.975 ; 6.423,-2.932 6.509,-2.932 ; 6.423,-2.888 6.509,-2.888 ; 6.638,-2.975 7.2,-2.975 ; 6.984,-3.622 7.329,-3.622 ; 6.984,-2.932 7.2,-2.932 ; 6.984,-2.888 10.352,-2.888 ; 6.984,-2.845 10.395,-2.845 ; 7.113,-3.666 7.373,-3.666 ; 7.243,-3.709 7.373,-3.709 ; 7.329,-3.018 9.057,-3.018 ; 7.329,-2.975 9.057,-2.975 ; 7.329,-2.932 9.057,-2.932 ; 7.416,-3.493 7.502,-3.493 ; 7.632,-3.061 10.309,-3.061 ; 7.718,-3.104 10.309,-3.104 ; 7.761,-3.147 10.266,-3.147 ; 7.847,-3.191 10.266,-3.191 ; 7.934,-3.234 10.266,-3.234 ; 7.977,-1.679 8.279,-1.679 ; 7.977,-1.636 8.107,-1.636 ; 8.02,-3.277 10.266,-3.277 ; 8.063,-3.32 10.266,-3.32 ; 8.409,-3.622 8.97,-3.622 ; 8.409,-3.579 9.661,-3.579 ; 8.409,-3.363 10.266,-3.363 ; 8.409,-1.679 8.495,-1.679 ; 8.452,-3.536 9.661,-3.536 ; 8.452,-3.493 9.661,-3.493 ; 8.452,-3.45 10.309,-3.45 ; 8.452,-3.407 10.266,-3.407 ; 8.495,-3.666 8.97,-3.666 ; 8.538,-3.709 8.97,-3.709 ; 8.582,-3.752 9.013,-3.752 ; 8.582,-1.982 9.143,-1.982 ; 8.582,-1.938 9.1,-1.938 ; 8.582,-1.895 9.057,-1.895 ; 8.625,-3.795 9.057,-3.795 ; 8.668,-3.838 9.057,-3.838 ; 8.711,-3.882 9.057,-3.882 ; 8.754,-3.925 9.013,-3.925 ; 8.797,-3.968 8.97,-3.968 ; 8.841,-4.097 9.229,-4.097 ; 8.841,-4.054 8.97,-4.054 ; 8.841,-4.011 8.97,-4.011 ; 8.841,-1.852 8.97,-1.852 ; 8.884,-4.141 9.272,-4.141 ; 8.927,-4.227 9.272,-4.227 ; 8.927,-4.184 9.272,-4.184 ; 8.97,-4.27 9.186,-4.27 ; 9.013,-4.313 9.186,-4.313 ; 9.057,-4.4 9.186,-4.4 ; 9.057,-4.357 9.186,-4.357 ; 9.1,-3.622 9.661,-3.622 ; 9.143,-4.054 9.186,-4.054 ; 9.143,-3.709 9.704,-3.709 ; 9.143,-3.666 9.704,-3.666 ; 9.229,-3.752 9.704,-3.752 ; 9.272,-3.018 10.309,-3.018 ; 9.272,-2.975 10.309,-2.975 ; 9.272,-2.932 10.352,-2.932 ; 9.272,-2.327 9.532,-2.327 ; 9.272,-2.284 9.445,-2.284 ; 9.272,-2.241 9.402,-2.241 ; 9.316,-3.795 9.661,-3.795 ; 9.445,-3.838 9.661,-3.838 ; 9.488,-3.882 9.532,-3.882 ; 9.791,-3.536 10.309,-3.536 ; 9.791,-3.493 10.309,-3.493 ; 9.834,-3.579 10.352,-3.579 ; 9.834,-2.543 10.741,-2.543 ; 9.834,-2.154 17.131,-2.154 ; 9.834,-2.111 17.088,-2.111 ; 9.877,-2.068 17.045,-2.068 ; 9.877,-2.025 17.045,-2.025 ; 9.92,-3.622 10.352,-3.622 ; 9.92,-2.5 10.827,-2.5 ; 9.92,-2.457 12.036,-2.457 ; 9.92,-1.982 17.002,-1.982 ; 9.963,-3.666 10.395,-3.666 ; 9.963,-2.413 12.079,-2.413 ; 10.05,-3.709 10.395,-3.709 ; 10.05,-2.37 12.209,-2.37 ; 10.05,-1.938 16.958,-1.938 ; 10.05,-1.895 16.915,-1.895 ; 10.093,-6.386 10.179,-6.386 ; 10.093,-6.343 10.266,-6.343 ; 10.093,-6.3 10.266,-6.3 ; 10.093,-2.327 12.252,-2.327 ; 10.093,-2.284 12.252,-2.284 ; 10.093,-2.241 17.218,-2.241 ; 10.093,-2.198 17.174,-2.198 ; 10.093,-1.852 16.872,-1.852 ; 10.136,-6.256 10.309,-6.256 ; 10.179,-6.213 10.352,-6.213 ; 10.179,-3.752 10.395,-3.752 ; 10.179,-1.809 16.829,-1.809 ; 10.222,-6.17 10.352,-6.17 ; 10.222,-6.127 10.395,-6.127 ; 10.222,-3.882 10.438,-3.882 ; 10.222,-3.838 10.438,-3.838 ; 10.222,-3.795 10.395,-3.795 ; 10.266,-6.084 10.395,-6.084 ; 10.266,-3.925 10.481,-3.925 ; 10.266,-1.766 16.786,-1.766 ; 10.266,-1.723 16.743,-1.723 ; 10.266,-1.679 16.699,-1.679 ; 10.309,-6.041 10.438,-6.041 ; 10.309,-5.997 10.481,-5.997 ; 10.309,-5.954 10.481,-5.954 ; 10.309,-4.054 10.525,-4.054 ; 10.309,-4.011 10.525,-4.011 ; 10.309,-3.968 10.525,-3.968 ; 10.309,-1.636 16.656,-1.636 ; 10.352,-5.911 10.481,-5.911 ; 10.352,-5.868 10.525,-5.868 ; 10.352,-4.184 10.611,-4.184 ; 10.352,-4.141 10.611,-4.141 ; 10.352,-4.097 10.568,-4.097 ; 10.352,-1.593 16.613,-1.593 ; 10.395,-5.825 10.525,-5.825 ; 10.395,-5.781 10.568,-5.781 ; 10.395,-5.738 10.568,-5.738 ; 10.395,-4.313 10.654,-4.313 ; 10.395,-4.27 10.654,-4.27 ; 10.395,-4.227 10.611,-4.227 ; 10.438,-5.695 10.611,-5.695 ; 10.438,-5.652 10.611,-5.652 ; 10.438,-5.609 10.654,-5.609 ; 10.438,-5.566 10.654,-5.566 ; 10.438,-5.522 10.654,-5.522 ; 10.438,-5.479 10.654,-5.479 ; 10.438,-5.436 10.654,-5.436 ; 10.438,-5.393 10.697,-5.393 ; 10.438,-4.659 10.697,-4.659 ; 10.438,-4.616 10.697,-4.616 ; 10.438,-4.572 10.697,-4.572 ; 10.438,-4.529 10.697,-4.529 ; 10.438,-4.486 10.654,-4.486 ; 10.438,-4.443 10.654,-4.443 ; 10.438,-4.4 10.654,-4.4 ; 10.438,-4.357 10.654,-4.357 ; 10.438,-1.55 16.527,-1.55 ; 10.481,-5.35 10.697,-5.35 ; 10.481,-5.306 10.697,-5.306 ; 10.481,-5.263 10.697,-5.263 ; 10.481,-5.22 10.697,-5.22 ; 10.481,-5.177 10.741,-5.177 ; 10.481,-4.788 10.741,-4.788 ; 10.481,-4.745 10.741,-4.745 ; 10.481,-4.702 10.697,-4.702 ; 10.481,-1.507 16.483,-1.507 ; 10.525,-5.134 10.741,-5.134 ; 10.525,-5.091 10.741,-5.091 ; 10.525,-5.047 10.741,-5.047 ; 10.525,-5.004 10.741,-5.004 ; 10.525,-4.961 10.741,-4.961 ; 10.525,-4.918 10.741,-4.918 ; 10.525,-4.875 10.741,-4.875 ; 10.525,-4.832 10.741,-4.832 ; 10.568,-1.463 16.397,-1.463 ; 10.611,-1.42 16.354,-1.42 ; 10.697,-1.377 16.311,-1.377 ; 10.784,-1.334 16.224,-1.334 ; 10.87,-1.291 16.181,-1.291 ; 10.913,-1.248 16.138,-1.248 ; 10.956,-2.543 12.036,-2.543 ; 10.956,-2.5 12.036,-2.5 ; 11,-1.204 16.052,-1.204 ; 11.043,-2.586 11.993,-2.586 ; 11.086,-1.161 15.965,-1.161 ; 11.172,-1.118 15.922,-1.118 